# Altium footprint library Footprints.PcbLib: 196 footprints (part 8 of 13)
Each footprint in its own frame and in the unit in brackets; x right, y up, seen from the top. Pads: shape width x height; smd on the part's side, far side on the other; paste and mask are expansions set on the pad; w line width, h text height; cw(c..) or ccw(c..) is an arc to the next point about the centre after c.
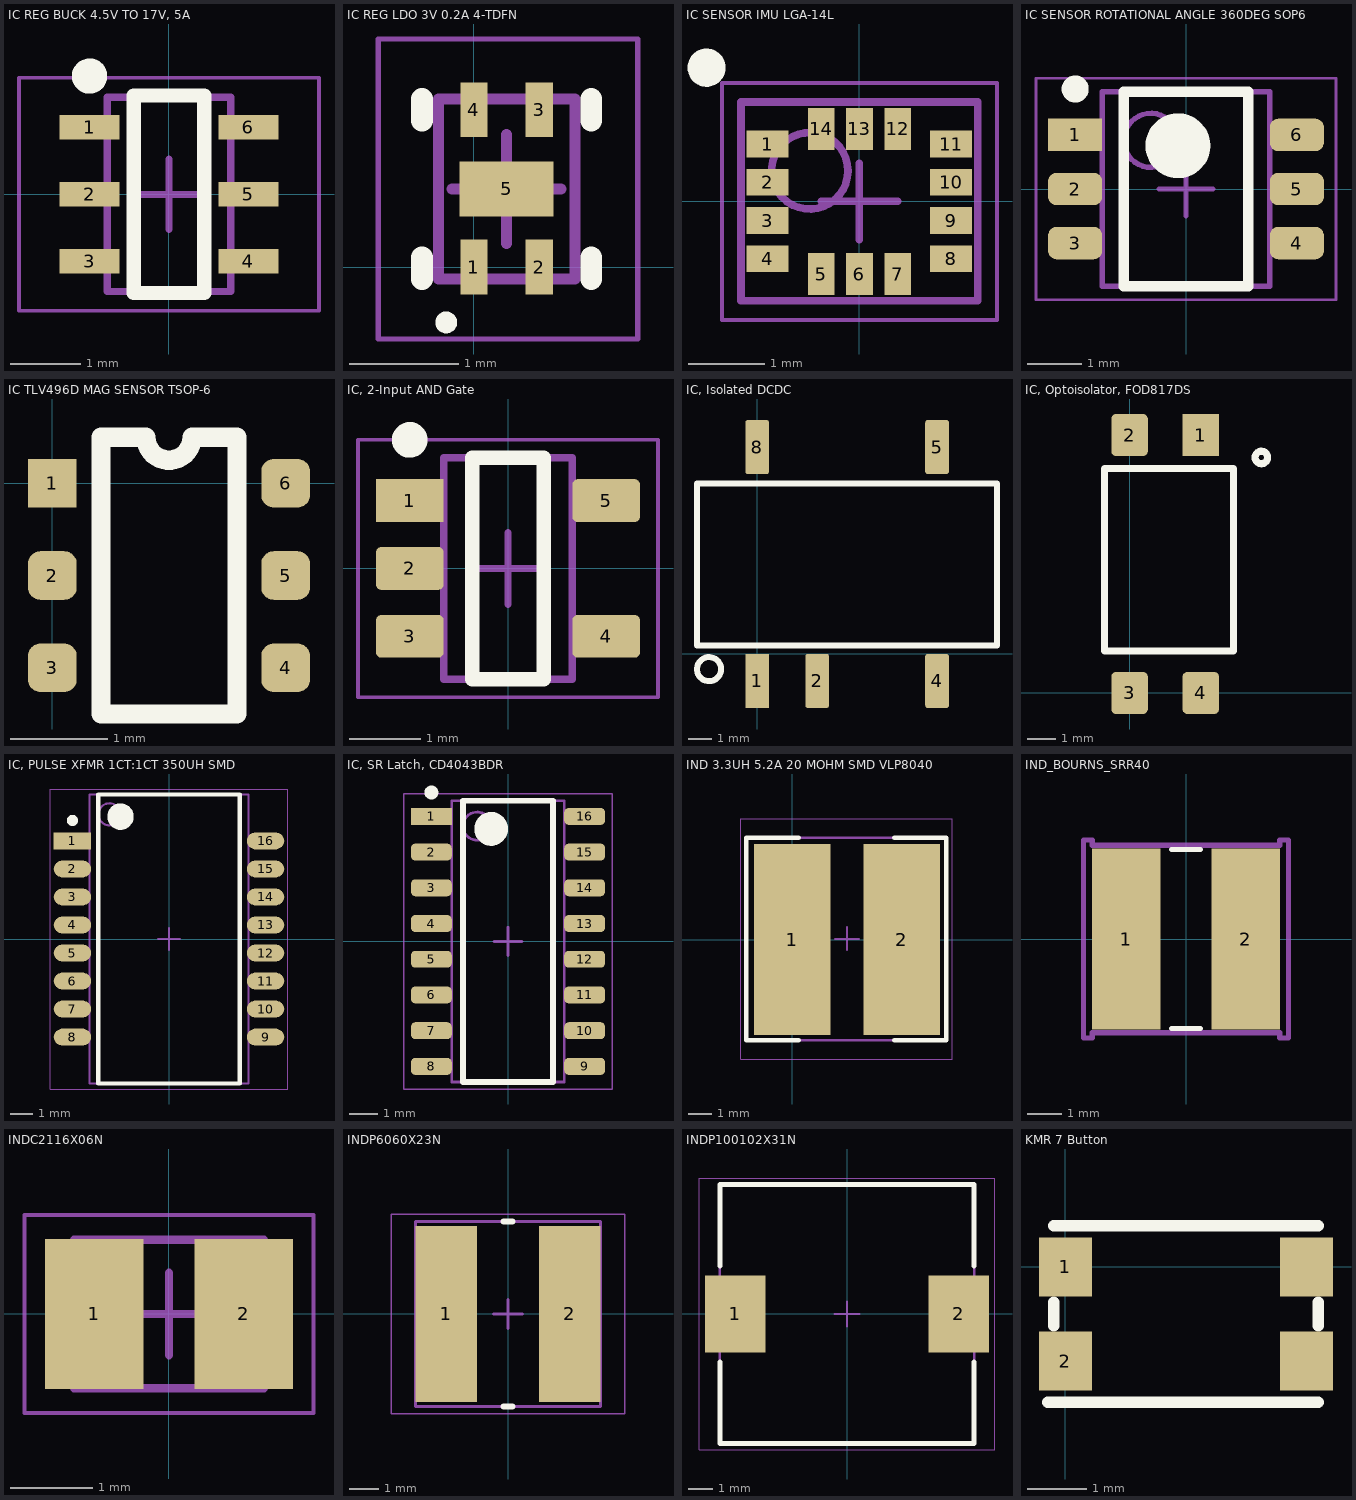
[diagram p7: the footprints below, top view; thin cyan lines are the x and y axes]

## IC REG BUCK 4.5V TO 17V, 5A [mm] "Buck Switching Regulator IC Positive Adjustable 0.6V 1 Output 5A SOT-23-6 Thin, TSOT-23-6"
height 1.1
pads (6):
  rect 0.85x0.35 smd: 1(-1.125,0.95) 2(-1.125,0) 3(-1.125,-0.95) 4(1.125,-0.95) 5(1.125,0) 6(1.125,0.95)
Top Overlay:
  circle w0.25: c-1.125,1.675 r0.125
  lines w0.2: -0.5,-1.4 -0.5,1.4 0.5,1.4 0.5,-1.4 -0.5,-1.4
Assembly Top:
  lines w0.1: -0.875,-1.375 0.875,-1.375 0.875,1.375 -0.875,1.375 -0.875,-1.375
Courtyard Top:
  lines w0.05: -2.125,-1.65 2.125,-1.65 2.125,1.65 -2.125,1.65 -2.125,-1.65
  lines w0.1: -0.5,0 0.5,0 ; 0,-0.5 0,0.5
3D body "IC REG BUCK 4.5V TO 17V, 5A.step": height 1.1, standoff 0, extent -1.525,-1.375 1.525,1.375

## IC REG LDO 3V 0.2A 4-TDFN [mm] "QFN, 4-Leads, Body 1.20x1.60mm, Pitch 0.50mm/1.40mm, Thermal Pad 0.86x0.50mm, IPC Medium Density"
height 0.6
pads (5):
  rect 0.25x0.5 smd: 1(0,0) 2(0.6,0) 3(0.6,1.44) 4(0,1.44)
  rect 0.86x0.5 smd: 5(0.3,0.715)
Top Overlay:
  circle w0.1: c-0.254,-0.508 r0.05
  lines w0.2: -0.475,-0.11 -0.475,0.09 ; -0.475,1.34 -0.475,1.54 ; 1.075,-0.11 1.075,0.09 ; 1.075,1.34 1.075,1.54
Mechanical 13:
  lines w0.1: -0.325,-0.11 0.925,-0.11 0.925,1.54 -0.325,1.54 -0.325,-0.11
Mechanical 15:
  lines w0.05: -0.875,-0.66 1.5,-0.66 1.5,2.09 -0.875,2.09 -0.875,-0.66
  lines w0.1: -0.2,0.715 0.8,0.715 ; 0.3,0.215 0.3,1.215
3D body "IC REG LDO 3V 0.2A 4-TDFN.step": height 0.6, standoff 0, extent -0.325,-0.111 0.925,1.541

## IC SENSOR IMU LGA-14L [mm] "PQFN, 14-Leads, Body 3.00x2.50mm, Pitch 0.50mm, IPC Medium Density"
height 0.86
pads (14):
  rect 0.55x0.35 smd: 1(-1.2,0.75) 2(-1.2,0.25) 3(-1.2,-0.25) 4(-1.2,-0.75) 8(1.2,-0.75) 9(1.2,-0.25) 10(1.2,0.25) 11(1.2,0.75)
  rect 0.35x0.55 smd: 5(-0.5,-0.95) 6(0,-0.95) 7(0.5,-0.95) 12(0.5,0.95) 13(0,0.95) 14(-0.5,0.95)
Top Overlay:
  circle w0.25: c-2,1.75 r0.125
Mechanical 13:
  circle w0.1: c-0.65,0.4 r0.5
  lines w0.1: -1.55,-1.3 -1.55,1.3 1.55,1.3 1.55,-1.3 -1.55,-1.3
Mechanical 15:
  lines w0.05: -1.8,-1.55 -1.8,1.55 1.8,1.55 1.8,-1.55 -1.8,-1.55
  lines w0.1: -0.5,0 0.5,0 ; 0,-0.5 0,0.5
3D body "IC SENSOR IMU LGA-14L.step": height 0.86, standoff 0, extent -1.55,-1.3 1.55,1.3

## IC SENSOR ROTATIONAL ANGLE 360DEG SOP6 [mm] "TSOP, 6-Leads, Body 3.60x3.00mm, Pitch 1.00mm, IPC Medium Density"
height 1.05
pads (6):
  rect 1x0.6 smd: 1(-2.05,1)
  rrect50% 1x0.6 smd: 2(-2.05,0) 3(-2.05,-1) 4(2.05,-1) 5(2.05,0) 6(2.05,1)
Top Overlay:
  circle w0.25: c-2.05,1.85 r0.125
  circle w0.6: c-0.15,0.8 r0.3
  lines w0.2: -1.15,-1.8 -1.15,1.8 1.15,1.8 1.15,-1.8 -1.15,-1.8
Mechanical 13:
  circle w0.1: c-0.65,0.9 r0.5
  lines w0.1: -1.55,-1.8 -1.55,1.8 1.55,1.8 1.55,-1.8 -1.55,-1.8
Mechanical 15:
  lines w0.05: -2.775,-2.05 -2.775,2.05 2.775,2.05 2.775,-2.05 -2.775,-2.05
  lines w0.1: -0.5,0 0.5,0 ; 0,-0.5 0,0.5
3D body "IC SENSOR ROTATIONAL ANGLE 360DEG SOP6.step": height 1.05, standoff 0, extent -2.1,-1.8 2.1,1.8

## IC TLV496D MAG SENSOR TSOP-6 [mm]
pads (6):
  rect 0.5x0.5 smd: 1(0,0)
  rrect50% 0.5x0.5 smd: 2(0,-0.95) 3(0,-1.9) 4(2.4,-1.9) 5(2.4,-0.95) 6(2.4,0)
Top Overlay:
  lines w0.2: 0.5,-2.375 0.5,0.475 0.962,0.475 ccw(c1.2,0.475) 1.438,0.475 1.9,0.475 1.9,-2.375 0.5,-2.375
3D body "User Library-TSOP-6.step": height 1, standoff 0, extent -0.105,-2.44 2.595,0.56

## IC, 2-Input AND Gate [mm] "IC GATE AND 1CH 2-INP 5-SSOP"
height 1.25
pads (5):
  rect 0.95x0.6 smd: 1(-1.375,0.95)
  rrect25% 0.95x0.6 smd: 2(-1.375,0) 3(-1.375,-0.95) 4(1.375,-0.95) 5(1.375,0.95)
Top Overlay:
  circle w0.25: c-1.375,1.8 r0.125
  lines w0.2: -0.5,-1.55 0.5,-1.55 0.5,1.55 -0.5,1.55 -0.5,-1.55
Mechanical 13:
  lines w0.1: -0.9,-1.55 0.9,-1.55 0.9,1.55 -0.9,1.55 -0.9,-1.55
Mechanical 15:
  lines w0.05: -2.1,-1.8 2.1,-1.8 2.1,1.8 -2.1,1.8 -2.1,-1.8
  lines w0.1: -0.5,0 0.5,0 ; 0,-0.5 0,0.5
3D body: height 1.25, standoff 0, extent -0.899,-1.549 0.899,1.549

## IC, Isolated DCDC [mm]
pads (5):
  rect 1x2.29 smd: 1(0,-1.15)
  rrect20% 1x2.29 smd: 2(2.54,-1.15) 4(7.62,-1.15) 5(7.62,8.76) 8(0,8.76)
Top Overlay:
  circle w0.254: c-2.04,-0.65 r0.51
  lines w0.254: -2.54,0.35 -2.54,7.22 10.16,7.22 10.16,0.35 -2.54,0.35
3D body: height 7, standoff 0.25, extent -2.539,0.351 10.159,7.219

## IC, Optoisolator, FOD817DS [mm]
pads (4):
  rect 1.3x1.5 smd: 1(2.54,9.2)
  rrect25% 1.3x1.5 smd: 2(0,9.2) 3(0,0) 4(2.54,0)
Top Overlay:
  circle w0.254: c4.7,8.4 r0.224
  lines w0.254: -0.9,1.5 3.7,1.5 3.7,8 -0.9,8 -0.9,1.5
3D body: height 3.5, standoff 0.85, extent -0.899,1.501 3.699,7.999

## IC, PULSE XFMR 1CT:1CT 350UH SMD [mm] "PULSE XFMR 1CT:1CT 350UH SMD"
height 5.9
pads (16):
  rect 1.7x0.76 smd: 1(-4.375,4.445)
  oval 1.7x0.76 smd: 2(-4.375,3.175) 3(-4.375,1.905) 4(-4.375,0.635) 5(-4.375,-0.635) 6(-4.375,-1.905) 7(-4.375,-3.175) 8(-4.375,-4.445) 9(4.375,-4.445) 10(4.375,-3.175) 11(4.375,-1.905) 12(4.375,-0.635) 13(4.375,0.635) 14(4.375,1.905) 15(4.375,3.175) 16(4.375,4.445)
Top Overlay:
  circle w0.25: c-4.375,5.375 r0.125
  circle w0.6: c-2.2,5.55 r0.3
  lines w0.2: -3.2,-6.55 -3.2,6.55 3.2,6.55 3.2,-6.55 -3.2,-6.55
Mechanical 13:
  circle w0.1: c-2.7,5.65 r0.5
  lines w0.1: -3.6,-6.55 -3.6,6.55 3.6,6.55 3.6,-6.55 -3.6,-6.55
Mechanical 15:
  lines w0.05: -5.375,-6.8 -5.375,6.8 5.375,6.8 5.375,-6.8 -5.375,-6.8
  lines w0.1: -0.5,0 0.5,0 ; 0,-0.5 0,0.5
3D body "1CT 350UH SMD.step": height 5.9, standoff 0, extent -4.65,-6.55 4.65,6.55

## IC, SR Latch, CD4043BDR [mm] "SR LATCH"
height 1.75
pads (16):
  rect 1.45x0.6 smd: 1(-2.725,4.445)
  rrect50% 1.45x0.6 smd: 2(-2.725,3.175) 3(-2.725,1.905) 4(-2.725,0.635) 5(-2.725,-0.635) 6(-2.725,-1.905) 7(-2.725,-3.175) 8(-2.725,-4.445) 9(2.725,-4.445) 10(2.725,-3.175) 11(2.725,-1.905) 12(2.725,-0.635) 13(2.725,0.635) 14(2.725,1.905) 15(2.725,3.175) 16(2.725,4.445)
Top Overlay:
  circle w0.25: c-2.725,5.295 r0.125
  circle w0.6: c-0.6,4 r0.3
  lines w0.2: -1.6,-5 -1.6,5 1.6,5 1.6,-5 -1.6,-5
Mechanical 13:
  circle w0.1: c-1.1,4.1 r0.5
  lines w0.1: -2,-5 -2,5 2,5 2,-5 -2,-5
Mechanical 15:
  lines w0.05: -3.7,-5.25 -3.7,5.25 3.7,5.25 3.7,-5.25 -3.7,-5.25
  lines w0.1: -0.5,0 0.5,0 ; 0,-0.5 0,0.5
3D body: height 1.75, standoff 0.1, extent -2,-5 2,5

## IND 3.3UH 5.2A 20 MOHM SMD VLP8040 [mm] "IND 3.3UH 5.2A 20 MOHM SMD"
height 4
pads (2):
  rect 3.3x8.2 smd: 1(0,0) 2(4.7,0)
Top Overlay:
  lines w0.2: 0.275,-4.325 -1.975,-4.325 -1.975,4.375 0.275,4.375 ; 4.375,-4.325 6.625,-4.325 6.625,4.375 4.375,4.375
Assembly Top:
  lines w0.1: -1.975,-4.325 6.625,-4.325 6.625,4.375 -1.975,4.375 -1.975,-4.325
Courtyard Top:
  lines w0.05: -2.225,-5.15 6.875,-5.15 6.875,5.2 -2.225,5.2 -2.225,-5.15
  lines w0.1: 1.85,0.025 2.85,0.025 ; 2.35,-0.45 2.35,0.525
3D body "IND 3.3UH 5.2A 20 MOHM SMD VLP8040.step": height 4.1, standoff 0, extent -1.625,-4.675 6.975,3.925

## IND_BOURNS_SRR40 [mil]
pads (2):
  rect 79x209 smd: 1(-69,0) 2(69,0)
Top Overlay:
  lines w6: -16.4,-103.5 16.4,-103.5 ; -16.4,103.5 16.4,103.5
Mechanical 13:
  circle w0: c-95.5,0 r3
Mechanical 15:
  lines w6: -118.5,-114.5 -118.5,114.5 -108.5,114.5 -108.5,108.5 108.5,108.5 108.5,114.5 118.5,114.5 118.5,-114.5 108.5,-114.5 108.5,-108.5 -108.5,-108.5 -108.5,-114.5 -118.5,-114.5
3D body "IND_BOURNS_SRR4018.stp": height 79, standoff 0, extent -98.5,-104.5 98.5,104.5

## INDC2116X06N [mm] "Chip Inductor, 2-Leads, Body 2.10x1.60mm, IPC Medium Density"
height 0.6
pads (2):
  rect 1.19x1.82 smd: 1(-0.905,0) 2(0.905,0)
Mechanical 13:
  lines w0.1: -1.15,-0.9 1.15,-0.9 1.15,0.9 -1.15,0.9 -1.15,-0.9
Mechanical 15:
  lines w0.05: -1.75,-1.2 1.75,-1.2 1.75,1.2 -1.75,1.2 -1.75,-1.2
  lines w0.1: -0.5,0 0.5,0 ; 0,-0.5 0,0.5
3D body "INDC2116X06N.step": height 0.6, standoff 0, extent -1.15,-0.9 1.15,0.9

## INDP6060X23N [mm] "Precision Wire Wound Inductor, 2-Leads, Body 6.00x6.00mm, IPC Medium Density"
height 2.29
pads (2):
  rect 2.1x6 smd: 1(-2.1,0) 2(2.1,0)
Top Overlay:
  lines w0.2: -0.15,-3.15 0.15,-3.15 ; -0.15,3.15 0.15,3.15
Mechanical 13:
  lines w0.1: -3.15,-3.15 -3.15,3.15 3.15,3.15 3.15,-3.15 -3.15,-3.15
Mechanical 15:
  lines w0.05: -3.975,-3.4 -3.975,3.4 3.975,3.4 3.975,-3.4 -3.975,-3.4
  lines w0.1: -0.5,0 0.5,0 ; 0,-0.5 0,0.5
3D body "INDP6060X23N.step": height 2.39, standoff 0, extent -3.1,-3 3.1,3

## INDP100102X31N [mm] "Precision Wire Wound Inductor, 2-Leads, Body 10.00x10.20mm, IPC Medium Density"
height 3.1
pads (2):
  rect 2.45x3.1 smd: 1(-4.525,0) 2(4.525,0)
Top Overlay:
  lines w0.2: -5.15,-1.95 -5.15,-5.25 5.15,-5.25 5.15,-1.95 ; -5.15,1.95 -5.15,5.25 5.15,5.25 5.15,1.95
Mechanical 13:
  lines w0.1: -5.15,-5.25 -5.15,5.25 5.15,5.25 5.15,-5.25 -5.15,-5.25
Mechanical 15:
  lines w0.05: -5.975,-5.5 -5.975,5.5 5.975,5.5 5.975,-5.5 -5.975,-5.5
  lines w0.1: -0.5,0 0.5,0 ; 0,-0.5 0,0.5
3D body: height 3.1, standoff 0, extent -5.15,-5.25 5.15,5.25

## KMR 7 Button [mm]
pads (4):
  rect 0.9x1 smd: 1(0,0) 2(0,-1.6) ""(4.1,-1.6) ""(4.1,0)
Top Overlay:
  lines w0.2: -0.3,-2.3 4.3,-2.3 ; -0.2,-1 -0.2,-0.6 ; -0.2,0.7 4.3,0.7 ; 4.3,-1 4.3,-0.6